# Altium footprint library Footprints.PcbLib: 118 footprints (part 3 of 8)
Each footprint in its own frame and in the unit in brackets; x right, y up, seen from the top. Pads: shape width x height; smd on the part's side, far side on the other; paste and mask are expansions set on the pad; w line width, h text height; cw(c..) or ccw(c..) is an arc to the next point about the centre after c.
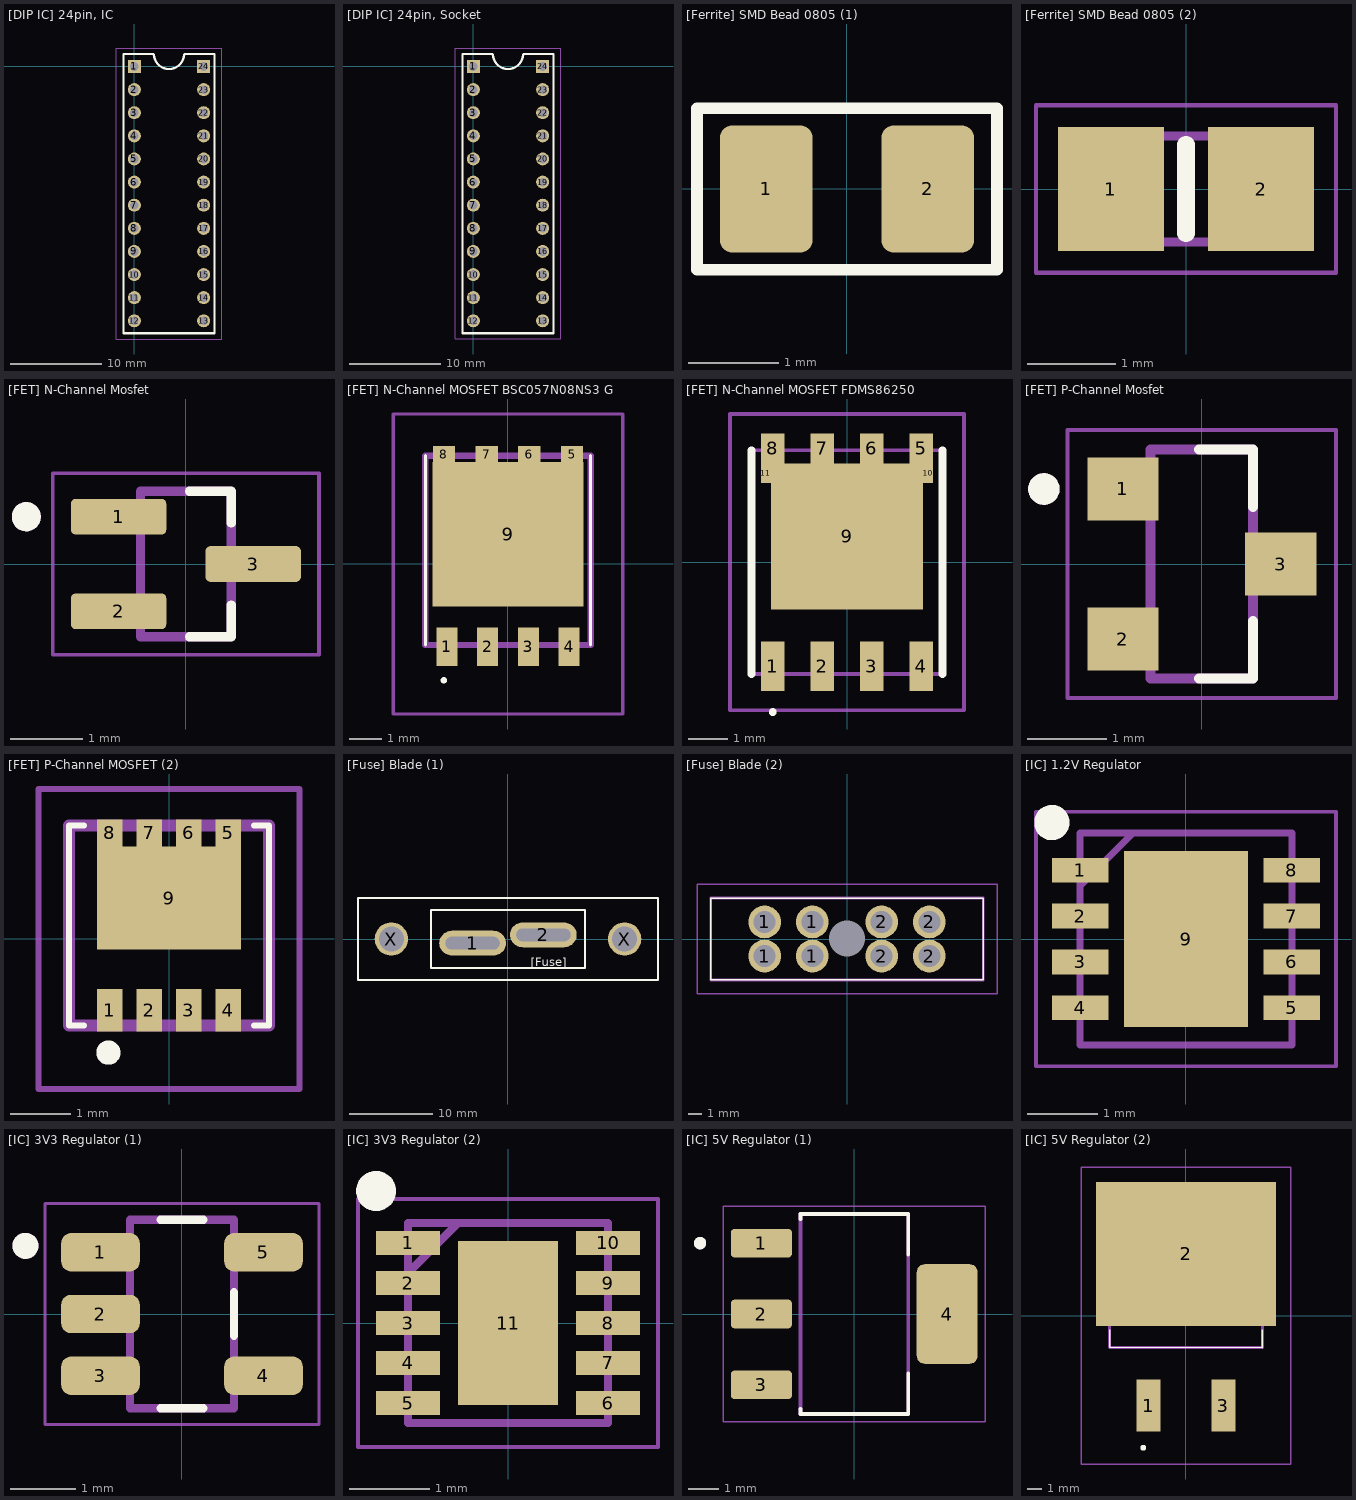
[diagram p2: the footprints below, top view; thin cyan lines are the x and y axes]

## [DIP IC] 24pin, IC [mm]
pads (24):
  rect 1.425x1.425 hole 0.95: 1(0,0) 24(7.62,0)
  round 1.425 hole 0.95: 2(0,-2.54) 3(0,-5.08) 4(0,-7.62) 5(0,-10.16) 6(0,-12.7) 7(0,-15.24) 8(0,-17.78) 9(0,-20.32) 10(0,-22.86) 11(0,-25.4) 12(0,-27.94) 13(7.62,-27.94) 14(7.62,-25.4) 15(7.62,-22.86) 16(7.62,-20.32) 17(7.62,-17.78) 18(7.62,-15.24) 19(7.62,-12.7) 20(7.62,-10.16) 21(7.62,-7.62) 22(7.62,-5.08) 23(7.62,-2.54)
Top Overlay:
  lines w0.254: -1.19,-29.31 8.81,-29.31 8.81,1.37 5.558,1.37 5.458,1.27 cw(c3.81,1.37) 2.162,1.27 2.062,1.37 -1.19,1.37 -1.19,-29.31
Part Border:
  lines w0.1: -2,-29.94 9.62,-29.94 9.62,2 -2,2 -2,-29.94
3D body "DIP IC [24pin, IC].step": height 3.6, standoff -3.75, extent -0.758,-29.03 8.378,1.09

## [DIP IC] 24pin, Socket [mm]
pads (24):
  rect 1.425x1.425 hole 0.95: 1(0,0) 24(7.62,0)
  round 1.425 hole 0.95: 2(0,-2.54) 3(0,-5.08) 4(0,-7.62) 5(0,-10.16) 6(0,-12.7) 7(0,-15.24) 8(0,-17.78) 9(0,-20.32) 10(0,-22.86) 11(0,-25.4) 12(0,-27.94) 13(7.62,-27.94) 14(7.62,-25.4) 15(7.62,-22.86) 16(7.62,-20.32) 17(7.62,-17.78) 18(7.62,-15.24) 19(7.62,-12.7) 20(7.62,-10.16) 21(7.62,-7.62) 22(7.62,-5.08) 23(7.62,-2.54)
Top Overlay:
  lines w0.254: -1.19,-29.31 8.81,-29.31 8.81,1.37 5.558,1.37 5.458,1.27 cw(c3.81,1.37) 2.162,1.27 2.062,1.37 -1.19,1.37 -1.19,-29.31
Part Border:
  lines w0.1: -2,-29.94 -2,2 9.62,2 9.62,-29.94 -2,-29.94
3D body "24pin DIP IC Socket.step": height 5.02, standoff -2.47, extent -1.19,-29.591 8.81,1.651

## [Ferrite] SMD Bead 0805 (1) [mil]
pads (2):
  rrect25% 40x55 smd: 1(-35,0) 2(35,0)
Top Overlay:
  lines w5: -65,-35 -65,35 65,35 65,-35 -65,-35
3D body "SMD Ferrite Bead [0805].STEP": height 43.31, standoff 0, extent -39.37,-23.62 39.37,23.62

## [Ferrite] SMD Bead 0805 (2) [mm] "742792040"
pads (2):
  rect 1.2x1.4 smd: 1(-0.85,0) 2(0.85,0)
Top Overlay:
  lines w0.2: 0,-0.5 0,0.5
Physical Outline:
  lines w0.1: -1,-0.6 -1,0.6 1,0.6 1,-0.6 -1,-0.6
Part Border:
  lines w0.05: -1.7,-0.95 -1.7,0.95 1.7,0.95 1.7,-0.95 -1.7,-0.95
3D body "742792040.stp": height 1.1, standoff 0, extent -1,-0.6 1,0.6

## [FET] N-Channel Mosfet [mm] "DMG1012UW-7"
pads (3):
  rrect25% 1.31x0.49 smd: 1(-0.925,0.65) 2(-0.925,-0.65) 3(0.925,0)
Top Overlay:
  circle w0.2: c-2.195,0.65 r0.1
  lines w0.127: 0.05,-1 0.625,-1 0.625,-0.565 ; 0.05,1 0.625,1 0.625,0.565
Physical Outline:
  circle w0.2: c-2.195,0.65 r0.1
  lines w0.127: -0.625,-1 0.625,-1 0.625,1 -0.625,1 -0.625,-1
Part Border:
  lines w0.05: -1.83,-1.25 1.83,-1.25 1.83,1.25 -1.83,1.25 -1.83,-1.25
3D body "step_temp.STEP": height 1.1, standoff 0, extent -1.05,-1.075 1.05,1.075

## [FET] N-Channel MOSFET BSC057N08NS3 G [mm] "BSC057N08NS3 G"
pads (9):
  rect 0.65x1.2 smd: 1(-1.905,-2.575) 2(-0.635,-2.575) 3(0.635,-2.575) 4(1.905,-2.575)
  rect 0.7x0.5 smd: 5(1.995,3.425) 6(0.665,3.425) 7(-0.665,3.425) 8(-1.995,3.425)
  rect 4.7x4.5 smd: 9(0,0.925)
Top Overlay:
  lines w0.1: -2.575,-2.525 -2.575,3.375 ; 2.575,-2.525 2.575,3.375 ; -2,-3.675 cw(c-2,-3.625) -2,-3.575 cw(c-2,-3.625) -2,-3.675
Physical Outline:
  lines w0.2: -2.575,-2.525 2.575,-2.525 2.575,3.375 -2.575,3.375 -2.575,-2.525
Part Border:
  lines w0.1: -3.575,-4.675 3.575,-4.675 3.575,4.675 -3.575,4.675 -3.575,-4.675
3D body "BSC057N08NS3GATMA1.stp": height 1.2, standoff 0, extent -2.575,-3.11 2.575,3.625

## [FET] N-Channel MOSFET FDMS86250 [mm] "FDMS86250"
pads (11):
  rect 0.61x1.27 smd: 1(-1.905,-2.67) 2(-0.635,-2.67) 3(0.635,-2.67) 4(1.905,-2.67)
  rect 0.61x0.77 smd: 5(1.905,2.92) 6(0.635,2.92) 7(-0.635,2.92) 8(-1.905,2.92)
  rect 3.91x3.75 smd: 9(0,0.66)
  rect 0.255x0.5 smd: 10(2.083,2.285) 11(-2.083,2.285)
Top Overlay:
  lines w0.1: -1.905,-3.9 ccw(c-1.905,-3.85) -1.905,-3.8 ccw(c-1.905,-3.85) -1.905,-3.9
  lines w0.2: -2.45,-2.875 -2.45,2.875 ; 2.45,-2.875 2.45,2.875
Physical Outline:
  lines w0.1: -2.45,-2.875 2.45,-2.875 2.45,2.875 -2.45,2.875 -2.45,-2.875
Part Border:
  lines w0.1: -3,-3.805 -3,3.805 3,3.805 3,-3.805 -3,-3.805
3D body "FDMS86250.stp": height 1.1, standoff 0, extent -2.5,-3.075 2.5,3.075

## [FET] P-Channel Mosfet [mm] "PMV48XP"
pads (3):
  rect 0.9x0.8 smd: 1(-1,0.95) 2(-1,-0.95) 3(1,0)
Top Overlay:
  circle w0.2: c-2,0.95 r0.1
  lines w0.127: -0.035,-1.45 0.65,-1.45 0.65,-0.72 ; -0.035,1.45 0.65,1.45 0.65,0.72
Physical Outline:
  circle w0.2: c-2,0.95 r0.1
  lines w0.127: -0.65,-1.45 0.65,-1.45 0.65,1.45 -0.65,1.45 -0.65,-1.45
Part Border:
  lines w0.05: -1.7,-1.7 1.7,-1.7 1.7,1.7 -1.7,1.7 -1.7,-1.7
3D body "SMD Mosfet (Part # PMV48XP).STEP": height 1.1, standoff 0, extent -1.15,-1.45 1.15,1.45

## [FET] P-Channel MOSFET (2) [mm]
pads (9):
  rect 0.42x0.7 smd: 1(-0.975,-1.175) 2(-0.325,-1.175) 3(0.325,-1.175) 4(0.975,-1.175)
  rect 0.42x0.45 smd: 5(0.975,1.75) 6(0.325,1.75) 7(-0.325,1.75) 8(-0.975,1.75)
  rect 2.37x1.7 smd: 9(0,0.675)
Top Overlay:
  lines w0.1: -1.4,-1.425 -1.65,-1.425 -1.65,1.875 -1.4,1.875 ; 1.4,-1.425 1.65,-1.425 1.65,1.875 1.4,1.875
  lines w0.2: -1.1,-1.875 cw(c-1,-1.875) -0.9,-1.875 cw(c-1,-1.875) -1.1,-1.875
Physical Outline:
  lines w0.2: -1.65,-1.425 1.65,-1.425 1.65,1.875 -1.65,1.875 -1.65,-1.425
Part Border:
  lines w0.1: -2.15,-2.475 -2.15,2.475 2.15,2.475 2.15,-2.475 -2.15,-2.475
3D body "FDMC2523P.stp": height 0.85, standoff 0, extent -1.65,-1.415 1.65,1.885

## [Fuse] Blade (1) [mm]
pads (4):
  oval 8x3 hole 1.5 slot 6.5 at 0 deg: 1(-4.25,-0.5) 2(4.25,0.5)
  round 4 hole 3: X(-14,0) X(14,0)
Top Overlay:
  lines w0.254: -18,-4.9 18,-4.9 18,4.9 -18,4.9 -18,-4.9 ; -9.25,-3.5 -9.25,3.5 9.25,3.5 9.25,-3.5 -9.25,-3.5
  text "[Fuse]" at 2.738,-3.25 h1
3D body "Blade Fuse Socket.step": height 16.5, standoff -7.5, extent -18.5,-5 18.5,5

## [Fuse] Blade (2) [mm]
pads (9):
  round 2.4 hole 1.6: 1(-6.04,-1.25) 1(-6.04,1.25) 1(-2.54,-1.25) 1(-2.54,1.25) 2(2.54,-1.25) 2(2.54,1.25) 2(6.04,-1.25) 2(6.04,1.25)
  round 1.325 hole 2.65 unplated: ""(0,0.045)
Top Overlay:
  lines w0.1: -10,-3 -10,3 10,3 10,-3 -10,-3
Physical Outline:
  lines w0.2: -10,-3 -10,3 10,3 10,-3 -10,-3
Part Border:
  lines w0.1: -11,-4 -11,4 11,4 11,-4 -11,-4
3D body "178.6165.0002.stp": height 18.03, standoff -3.57, extent -10,-3 10,3

## [IC] 1.2V Regulator [mm]
pads (9):
  rect 0.8x0.35 smd: 1(-1.5,0.975) 2(-1.5,0.325) 3(-1.5,-0.325) 4(-1.5,-0.975) 5(1.5,-0.975) 6(1.5,-0.325) 7(1.5,0.325) 8(1.5,0.975)
  rect 1.75x2.5 smd: 9(0,0)
Top Overlay:
  circle w0.25: c-1.9,1.65 r0.125
Physical Outline:
  lines w0.1: -1.5,0.75 -0.75,1.5 ; -1.5,-1.5 -1.5,1.5 1.5,1.5 1.5,-1.5 -1.5,-1.5
Part Border:
  lines w0.05: -2.125,-1.8 -2.125,1.8 2.125,1.8 2.125,-1.8 -2.125,-1.8
3D body "TPS78412QWDRBRQ1.stp": height 1, standoff 0, extent -1.5,-1.5 1.5,1.5

## [IC] 3V3 Regulator (1) [mm] "Part #: LP2985-33DBVR"
pads (5):
  rrect50% 1.21x0.59 smd: 1(-1.255,0.95) 2(-1.255,0) 3(-1.255,-0.95) 4(1.255,-0.95) 5(1.255,0.95)
Top Overlay:
  circle w0.2: c-2.41,1.05 r0.1
  lines w0.127: -0.33,-1.45 0.33,-1.45 ; -0.33,1.45 0.33,1.45 ; 0.8,-0.335 0.8,0.335
Physical Outline:
  circle w0.2: c-2.41,1.05 r0.1
  lines w0.127: -0.8,-1.45 -0.8,1.45 0.8,1.45 0.8,-1.45 -0.8,-1.45
Part Border:
  lines w0.05: -2.11,-1.7 2.11,-1.7 2.11,1.7 -2.11,1.7 -2.11,-1.7
3D body "SMD 3V3 Regulator (LP2985-33DBVR).STEP": height 1.45, standoff 0, extent -1.4,-1.45 1.4,1.45

## [IC] 3V3 Regulator (2) [mm] "RT6150B-33GQW"
pads (11):
  rect 0.8x0.3 smd: 1(-1.25,1) 2(-1.25,0.5) 3(-1.25,0) 4(-1.25,-0.5) 5(-1.25,-1) 6(1.25,-1) 7(1.25,-0.5) 8(1.25,0) 9(1.25,0.5) 10(1.25,1)
  rect 1.25x2.05 smd: 11(0,0)
Top Overlay:
  circle w0.25: c-1.65,1.65 r0.125
Physical Outline:
  lines w0.1: -1.25,0.625 -0.625,1.25 ; -1.25,-1.25 -1.25,1.25 1.25,1.25 1.25,-1.25 -1.25,-1.25
Part Border:
  lines w0.05: -1.875,-1.55 -1.875,1.55 1.875,1.55 1.875,-1.55 -1.875,-1.55
3D body "RT6150B-33GQW.stp": height 0.8, standoff 0, extent -1.3,-1.25 1.3,1.25

## [IC] 5V Regulator (1) [mm] "LD1117S50CTR"
pads (4):
  rrect25% 1.98x0.93 smd: 1(-3.015,2.3) 2(-3.015,0) 3(-3.015,-2.3)
  rrect25% 1.98x3.23 smd: 4(3.015,0)
Top Overlay:
  circle w0.2: c-5.005,2.3 r0.1
  lines w0.127: -1.75,-3.085 -1.75,-3.25 1.75,-3.25 1.75,-1.935 ; -1.75,3.085 -1.75,3.25 1.75,3.25 1.75,1.935
Physical Outline:
  circle w0.2: c-5.005,2.3 r0.1
  lines w0.127: -1.75,-3.25 -1.75,3.25 1.75,3.25 1.75,-3.25 -1.75,-3.25
Part Border:
  lines w0.05: -4.255,-3.5 -4.255,3.5 4.255,3.5 4.255,-3.5 -4.255,-3.5
3D body "SMD 5V Regulator (LD1117S50CTR).STEP": height 1.8, standoff 0, extent -3.499,-3.25 3.498,3.25

## [IC] 5V Regulator (2) [mm] "511-L7805CD2T-TR"
pads (3):
  rect 1.6x3.5 smd: 1(-2.54,-6.094) 3(2.54,-6.094)
  rect 12.2x9.75 smd: 2(0,4.182)
Top Overlay:
  lines w0.1: -5.175,-0.956 -5.175,-2.156 5.175,-2.164 5.175,-0.956
  lines w0.2: -3,-8.956 ccw(c-2.9,-8.956) -2.8,-8.956 ccw(c-2.9,-8.956) -3,-8.956
Physical Outline:
  lines w0.2: -5.175,-2.164 5.175,-2.164 5.175,2.236 -5.175,2.236 -5.175,-2.164
Part Border:
  lines w0.1: -7.1,-10.056 7.1,-10.056 7.1,10.056 -7.1,10.056 -7.1,-10.056
3D body "L7805CD2T-TR.stp": height 4.6, standoff 0, extent -5.182,-7.572 5.182,8.319